# Altium integrated library ADC-DAC Ref.IntLib: 24 symbols
Pins are listed as number, name and electrical type; pins without a type are passive.

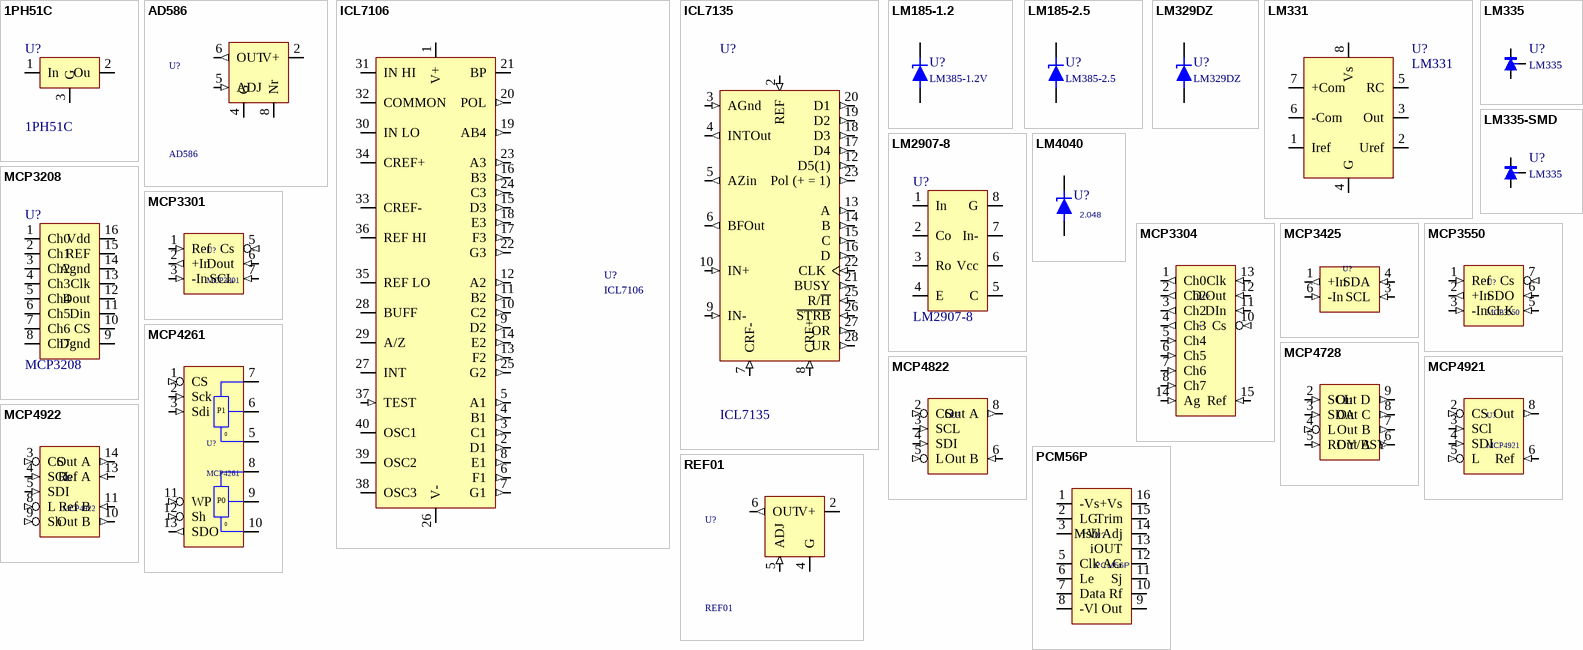
[diagram p0: symbols 1PH51C to REF01]

## 1PH51C
designator U?
50mA d1.7V 1mA; Price: 1
footprint TO92C
footprint TO92A
footprint TO92
pins: 1 In (power), 2 Ou (power), 3 G (power)

## AD586
designator U?
REF 5V 15ppm/C 4uV p-p 15ppm/1kh 10.8-36V
footprint SO8-150
pins: 1 nc hidden, 2 V+, 3 nc hidden, 4 G (power), 5 ADJ (in), 6 OUT (out), 8 Nr

## ICL7106
designator U?
3.5 ADC; Price: 6
footprint DIL40-600
signal-integrity model IC (Model Description)
pins: 1 V+ (power), 2 D1 (out), 3 C1 (out), 4 B1 (out), 5 A1 (out), 6 F1 (out), 7 G1 (out), 8 E1 (out), 9 D2 (out), 10 C2 (out), 11 B2 (out), 12 A2 (out), 13 F2 (out), 14 E2 (out), 15 D3 (out), 16 B3 (out), 17 F3 (out), 18 E3 (out), 19 AB4 (out), 20 POL (out), 21 BP, 22 G3 (out), 23 A3 (out), 24 C3 (out), 25 G2 (out), 26 V- (power), 27 INT, 28 BUFF, 29 A/Z, 30 IN LO, 31 IN HI, 32 COMMON, 33 CREF-, 34 CREF+, 35 REF LO, 36 REF HI, 37 TEST (in), 38 OSC3, 39 OSC2, 40 OSC1

## ICL7135
designator U?
4.5 ADC; Price: 3.8
footprint DIL28-600
signal-integrity model IC (Model Description)
pins: 1 VCC - (power) hidden to VCC -, 2 REF (in), 3 AGnd (in), 4 INTOut (out), 5 AZin (out), 6 BFOut (out), 7 CRF- (in), 8 CRF+ (in), 9 IN- (in), 10 IN+ (in), 11 VCC+ (power) hidden to VCC+, 12 D5(1) (out), 13 A (out), 14 B (out), 15 C (out), 16 D (out), 17 D4 (out), 18 D3 (out), 19 D2 (out), 20 D1 (out), 21 BUSY (out), 22 CLK (in), 23 Pol (+ = 1) (out), 24 DGnd (power) hidden to DGnd, 25 R/~{H} (in), 26 ~{STRB} (in), 27 OR (out), 28 UR (out)

## LM185-1.2
designator U?, comment LM385-1.2V
Price: 0.64
footprint TO92A
footprint TO92C
footprint TO92
footprint TO92-1.27
pins: 1 A, 2 C

## LM185-2.5
designator U?, comment LM385-2.5
Price: 0.666
footprint TO92A
footprint TO92C
footprint TO92
footprint TO92-1.27
pins: 1 A, 2 C, 3 hidden

## LM329DZ
designator U?
6.9V 0.6-15mA 0.8om; Price: 1.24
footprint TO92A
footprint TO92C
footprint TO92
footprint TO92-1.27
simulation model LM329DZ (Model Description)
pins: 1 A, 2 C

## LM331
designator U?
V-F Converter; Price: 3.5
footprint DIL8-300a
signal-integrity model IC (Model Description)
pins: 1 Iref, 2 Uref, 3 Out, 4 G, 5 RC, 6 -Com, 7 +Com, 8 Vs (power)

## LM335
designator U?
Termo-Sensor; Price: 1.1
footprint TO92C (Footprint not found)
pins: 1 (power), 2 (power), 3

## LM335-SMD
designator U?, comment LM335
Termo-Sensor
footprint SO8-150
pins: 1 nc hidden, 2 nc hidden, 3 nc hidden, 4 K (power), 5 Adj, 6 nc hidden, 7 nc hidden, 8 A (power)

## LM2907-8
designator U?
F-V Convertor; Price: 5
footprint DIL8-300a
pins: 1 In, 2 Co, 3 Ro, 4 E, 5 C, 6 Vcc, 7 In-, 8 G

## LM4040
designator U?  value 2.048  (hidden comment: LM4040)
Price: 0.666
footprint SOT23
pins: 1 C, 2 A, 3 hidden

## MCP3208
designator U?
Price: 6.4
footprint DIL16-300a
pins: 1 Ch0, 2 Ch1, 3 Ch2, 4 Ch3, 5 Ch4, 6 Ch5, 7 Ch6, 8 Ch7, 9 Dgnd, 10 CS, 11 Din, 12 Dout, 13 Clk, 14 Agnd, 15 REF, 16 Vdd

## MCP3301
designator U?
13bit ADC SPI 4.5-5.5V 0.45mA; Price: 4.2
footprint SO8-150
signal-integrity model IC (Model Description)
pins: 1 Ref (in), 2 +In (out), 3 -In (in), 4 Vss (power) hidden to g, 5 Cs (in), 6 Dout (in), 7 SCL (in), 8 Vdd (power) hidden to Vdd

## MCP3304
designator U?
8x13bit ADC SPI 100ksps; Price: 6.36
footprint SO16-150
pins: 1 Ch0 (out), 2 Ch2 (out), 3 Ch2 (out), 4 Ch3 (out), 5 Ch4 (in), 6 Ch5 (in), 7 Ch6 (in), 8 Ch7 (in), 9 Dg (power) hidden to Dg, 10 Cs (in), 11 DIn (in), 12 D Out (in), 13 Clk (in), 14 Ag (in), 15 Ref (in), 16 Vdd (in) hidden to Vdd

## MCP3425
designator U?
16bit ADC I2C 2.7-5.5V 0.2mA; Price: 6.12
footprint SOT23-6
signal-integrity model IC (Model Description)
pins: 1 +In (out), 2 Vss (power) hidden to g, 3 SCL (in), 4 SDA (in), 5 Vdd (power) hidden to Vdd, 6 -In (in)

## MCP3550
designator U?
22bit ADC SPI 2.7-5.5V 0.2mA; Price: 7.32
footprint SO8-150
signal-integrity model IC (Model Description)
pins: 1 Ref (in), 2 +In (out), 3 -In (in), 4 Vss (power) hidden to g, 5 CLK (in), 6 SDO (in), 7 Cs (in), 8 Vdd (power) hidden to Vdd

## MCP4261
designator U?
2x8bit Res  SPI 2.7-5.5V
footprint SO14-150
signal-integrity model IC (Model Description)
pins: 1 CS (in), 2 Sck (in), 3 Sdi (in), 4 Vss (power) hidden to g, 5 P1b, 6 P1w, 7 P1a, 8 P0b, 9 P0w, 10 P0a, 11 WP (in), 12 Sh (in), 13 SDO (out), 14 Vdd (power) hidden to Vdd
text: P1; 0; P0

## MCP4728
designator U?
4x12bit DAC I2C 2.7-5.5V EEPROM; Price: 3.4
footprint MSOP10
signal-integrity model IC (Model Description)
pins: 1 Vdd (power) hidden to Vdd, 2 SCL (in), 3 SDA (in), 4 L (in), 5 RDY/BSY (in), 6 Out A (out), 7 Out B (out), 8 Out C (out), 9 Out D (out), 10 Vss (power) hidden to g

## MCP4822
designator U?
2x12bit DAC SPI 2.7-5.5V; Price: 5.3
footprint SO8-150
signal-integrity model IC (Model Description)
pins: 1 Vdd (power) hidden to Vdd, 2 CS (in), 3 SCL (in), 4 SDI (in), 5 L (in), 6 Out B (in), 7 AVss (power) hidden to g, 8 Out A (out)

## MCP4921
designator U?
12bit DAC SPI 2.7-5.5V
footprint SO8-150
signal-integrity model IC (Model Description)
pins: 1 Vdd (power) hidden to Vdd, 2 CS (in), 3 SCl (in), 4 SDI (in), 5 L (in), 6 Ref (in), 7 AVss (power) hidden to g, 8 Out (out)

## MCP4922
designator U?
2x12bit DAC SPI 2.7-5.5V
footprint SO14-150
signal-integrity model IC (Model Description)
pins: 1 Vdd (power) hidden to Vdd, 3 CS (in), 4 SCL (in), 5 SDI (in), 8 L (in), 9 Sh (in), 10 Out B (out), 11 Ref B (in), 12 AVss (power) hidden to g, 13 Ref A (in), 14 Out A (out)

## PCM56P
designator U?
16Bit 1uS 10V/uS +/- 4.75-13.2V +10mA -25mA
footprint DIL16-300a
pins: 1 -Vs (power), 2 LG (power), 3 +Vl (power), 5 Clk (power), 6 Le (power), 7 Data (power), 8 -Vl (power), 9 Out (power), 10 Rf (power), 11 Sj (power), 12 AG (power), 13 iOUT (power), 14 Msb Adj (power), 15 Trim (power), 16 +Vs (power)

## REF01
designator U?
REF 10V 10ppm/C 20uV p-p 13-40V
footprint DIL8-300a
pins: 1 nc hidden, 2 V+, 3 nc hidden, 4 G (power), 5 ADJ (in), 6 OUT (out)